# Altium footprint library ADP_SMT.PcbLib: 210 footprints (part 6 of 15)
Each footprint in its own frame and in the unit in brackets; x right, y up, seen from the top. Pads: shape width x height; smd on the part's side, far side on the other; paste and mask are expansions set on the pad; w line width, h text height; cw(c..) or ccw(c..) is an arc to the next point about the centre after c.
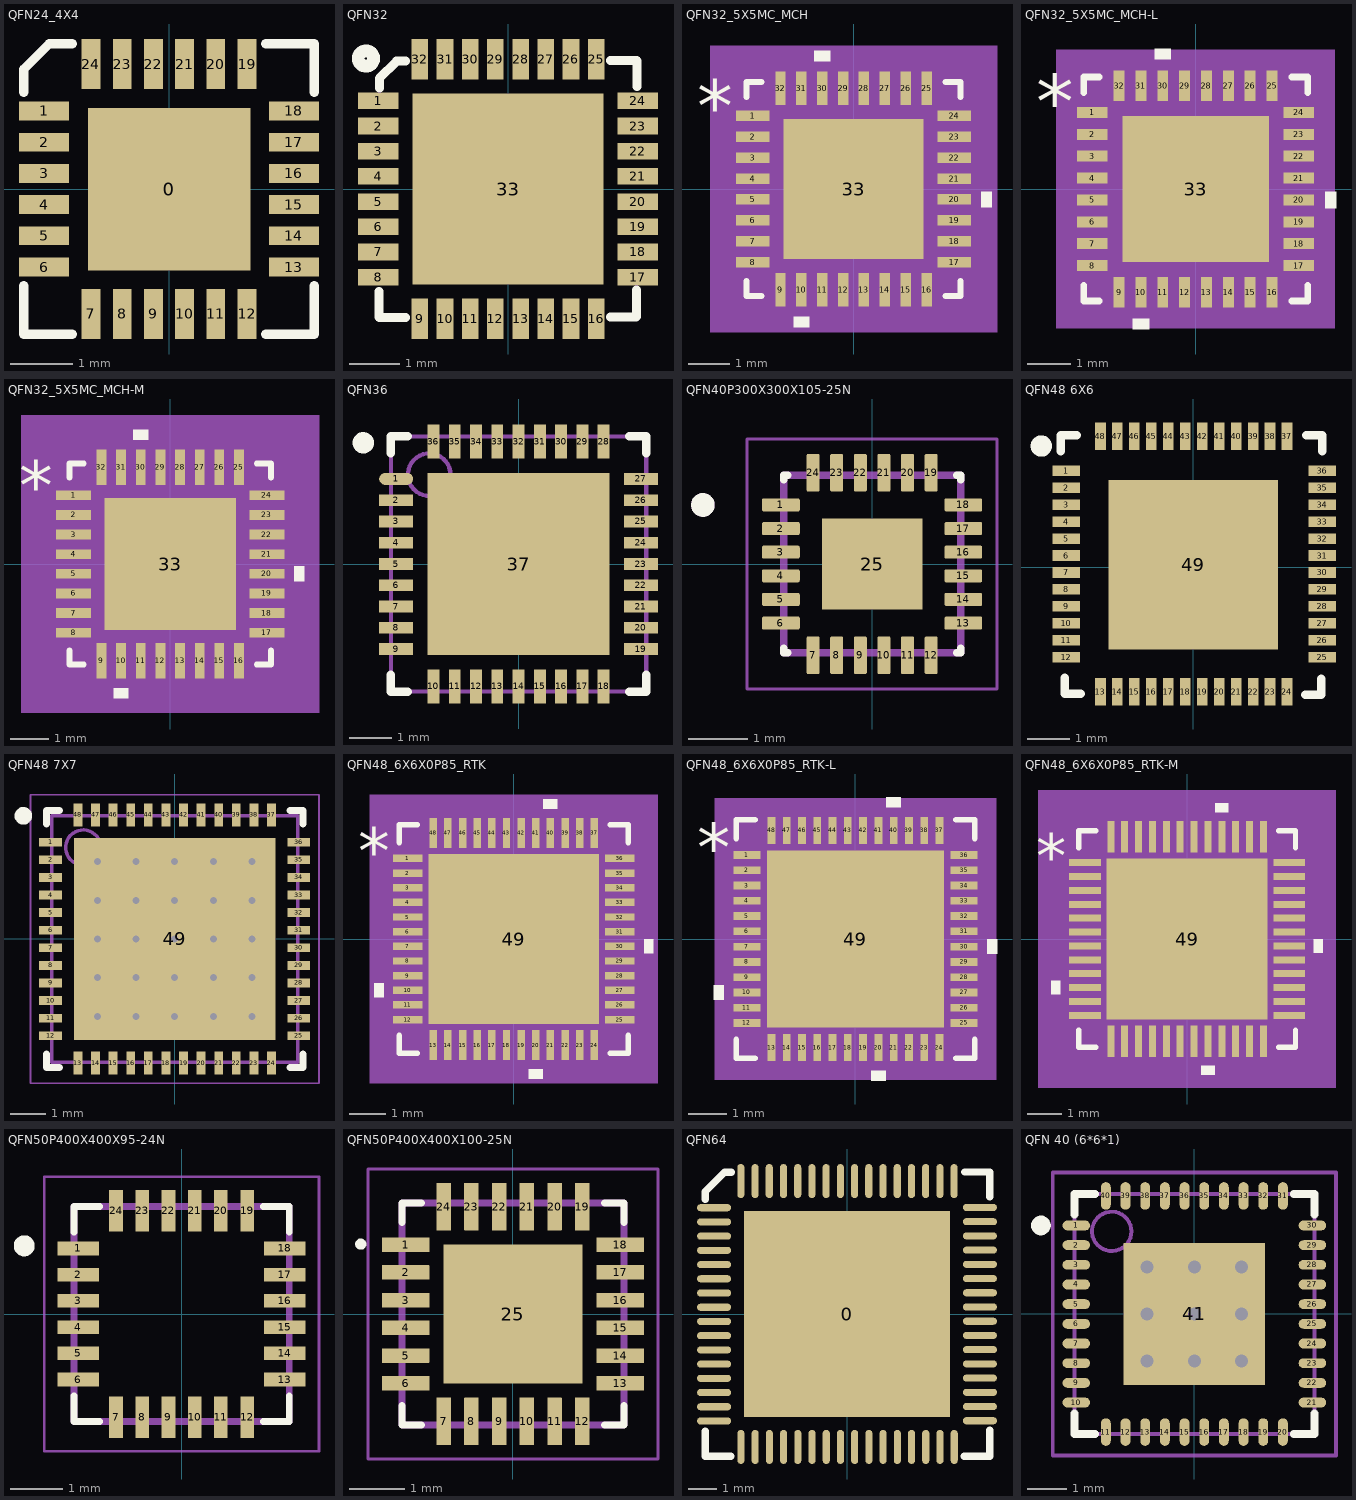
[diagram p5: the footprints below, top view; thin cyan lines are the x and y axes]

## QFN24_4X4 [mm]
pads (25):
  rect 2.6x2.6 smd: 0(0.005,0)
  rect 0.8x0.3 smd: 1(-2,1.25) 2(-2,0.75) 3(-2,0.25) 4(-2,-0.25) 5(-2,-0.75) 6(-2,-1.25) 13(2,-1.25) 14(2,-0.75) 15(2,-0.25) 16(2,0.25) 17(2,0.75) 18(2,1.25)
  rect 0.3x0.8 smd: 7(-1.25,-2) 8(-0.75,-2) 9(-0.25,-2) 10(0.25,-2) 11(0.75,-2) 12(1.25,-2) 19(1.25,2) 20(0.75,2) 21(0.25,2) 22(-0.25,2) 23(-0.75,2) 24(-1.25,2)
Top Overlay:
  lines w0.15: -2.325,-1.55 -2.325,-2.325 -1.55,-2.325 ; -2.325,1.55 -2.325,1.917 -1.917,2.325 -1.55,2.325 ; 1.55,-2.325 2.325,-2.325 2.325,-1.55 ; 1.55,2.325 2.325,2.325 2.325,1.55
3D body "QFN24.step": height 0.9, standoff 0, extent -1.997,-2.002 2.007,2.002

## QFN32 [mil]
pads (33):
  rect 31.5x13 smd: 1(-101.5,68.92) 2(-101.5,49.23) 3(-101.5,29.54) 4(-101.5,9.85) 5(-101.5,-9.85) 6(-101.5,-29.54) 7(-101.5,-49.23) 8(-101.5,-68.92) 17(101.5,-68.92) 18(101.5,-49.23) 19(101.5,-29.54) 20(101.5,-9.85) 21(101.5,9.85) 22(101.5,29.54) 23(101.5,49.23) 24(101.5,68.92)
  rect 13x31.5 smd: 9(-68.92,-101.5) 10(-49.23,-101.5) 11(-29.54,-101.5) 12(-9.85,-101.5) 13(9.85,-101.5) 14(29.54,-101.5) 15(49.23,-101.5) 16(68.92,-101.5) 25(68.92,101.5) 26(49.23,101.5) 27(29.54,101.5) 28(9.85,101.5) 29(-9.85,101.5) 30(-29.54,101.5) 31(-49.23,101.5) 32(-68.92,101.5)
  rect 149.61x149.61 smd: 33(0,0)
Top Overlay:
  circle w10: c-111,102 r6
  lines w7: -101,-80 -101,-100 -100.5,-100.5 -80,-100.5 ; -100.5,79 -100.5,86.5 -87,100 -80,100 ; 80,-100 100,-100 100.5,-99.5 100.5,-79 ; 80,100.5 100.5,100.5 101,100 101,80
3D body "qfn32-5x5.step": height 31.5, standoff 0, extent -98.2,-98.81 99.44,98.82

## QFN32_5X5MC_MCH [mil]
pads (33):
  rect 32x10 smd paste+0 mask+0: 1(-96.5,70) 2(-96.5,50) 3(-96.5,30) 4(-96.5,10) 5(-96.5,-10) 6(-96.5,-30) 7(-96.5,-50) 8(-96.5,-70) 17(96.5,-70) 18(96.5,-50) 19(96.5,-30) 20(96.5,-10) 21(96.5,10) 22(96.5,30) 23(96.5,50) 24(96.5,70)
  rect 10x32 smd paste+0 mask+0: 9(-70,-96.5) 10(-50,-96.5) 11(-30,-96.5) 12(-10,-96.5) 13(10,-96.5) 14(30,-96.5) 15(50,-96.5) 16(70,-96.5) 25(70,96.5) 26(50,96.5) 27(30,96.5) 28(10,96.5) 29(-10,96.5) 30(-30,96.5) 31(-50,96.5) 32(-70,96.5)
  rect 134x134 smd paste-66.5 mask-66.5: 33(0,0)
Top Overlay:
  region: -22.5,122.5 -37.5,122.5 -37.5,132.5 -22.5,132.5
  region: 122.5,-2.5 132.5,-2.5 132.5,-17.5 122.5,-17.5
  region: -42.5,-122.5 -57.5,-122.5 -57.5,-132.5 -42.5,-132.5
  lines w6: -102.5,-88.1 -102.5,-102.5 -88.1,-102.5 ; -102.5,88.1 -102.5,102.5 -88.1,102.5 ; 88.1,-102.5 102.5,-102.5 102.5,-88.1 ; 88.1,102.5 102.5,102.5 102.5,88.1
  text "*" at -150,55 h50
Top Paste:
  drawing of 25 lines, arcs and shapes, not listed
Top Solder:
  region: 54.37,-69.5 54.37,69.5 69.5,69.5 69.5,-69.5
  region: 38.63,-69.5 38.63,69.5 23.37,69.5 23.37,-69.5
  region: 7.63,-69.5 7.63,69.5 -7.63,69.5 -7.63,-69.5
  region: -23.37,-69.5 -23.37,69.5 -38.63,69.5 -38.63,-69.5
  region: -69.5,-69.5 -69.5,69.5 -54.37,69.5 -54.37,-69.5
  region: -69.5,-69.5 -69.5,-54.37 69.5,-54.37 69.5,-69.5
  region: -69.5,-38.63 -69.5,-23.37 69.5,-23.37 69.5,-38.63
  region: -69.5,-7.63 -69.5,7.63 69.5,7.63 69.5,-7.63
  region: -69.5,23.37 -69.5,38.63 69.5,38.63 69.5,23.37
  region: -69.5,54.37 -69.5,69.5 69.5,69.5 69.5,54.37
Mechanical 5:
  region: 137.5,-137.5 -137.5,-137.5 -137.5,137.5 137.5,137.5
Mechanical 13:
  lines w1: -97.5,47.5 -47.5,97.5 ; -100.5,-76 -97.5,-76 -97.5,-64 -100.5,-64 -100.5,-76 ; -100.5,-56 -97.5,-56 -97.5,-44 -100.5,-44 -100.5,-56 ; -100.5,-36 -97.5,-36 -97.5,-24 -100.5,-24 -100.5,-36 ; -100.5,-16 -97.5,-16 -97.5,-4 -100.5,-4 -100.5,-16 ; -100.5,4 -97.5,4 -97.5,16 -100.5,16 -100.5,4 ; -100.5,24 -97.5,24 -97.5,36 -100.5,36 -100.5,24 ; -100.5,44 -97.5,44 -97.5,56 -100.5,56 -100.5,44 ; -100.5,64 -97.5,64 -97.5,76 -100.5,76 -100.5,64 ; -97.5,-97.5 -97.5,97.5 97.5,97.5 97.5,-97.5 -97.5,-97.5 ; -76,-100.5 -64,-100.5 -64,-97.5 -76,-97.5 -76,-100.5 ; -76,97.5 -76,100.5 -64,100.5 -64,97.5 -76,97.5 ; -56,-100.5 -44,-100.5 -44,-97.5 -56,-97.5 -56,-100.5 ; -56,97.5 -56,100.5 -44,100.5 -44,97.5 -56,97.5 ; -36,-100.5 -24,-100.5 -24,-97.5 -36,-97.5 -36,-100.5 ; -36,97.5 -36,100.5 -24,100.5 -24,97.5 -36,97.5 ; -16,-100.5 -4,-100.5 -4,-97.5 -16,-97.5 -16,-100.5 ; -16,97.5 -16,100.5 -4,100.5 -4,97.5 -16,97.5 ; 4,-100.5 16,-100.5 16,-97.5 4,-97.5 4,-100.5 ; 4,97.5 4,100.5 16,100.5 16,97.5 4,97.5 ; 24,-100.5 36,-100.5 36,-97.5 24,-97.5 24,-100.5 ; 24,97.5 24,100.5 36,100.5 36,97.5 24,97.5 ; 44,-100.5 56,-100.5 56,-97.5 44,-97.5 44,-100.5 ; 44,97.5 44,100.5 56,100.5 56,97.5 44,97.5 ; 64,-100.5 76,-100.5 76,-97.5 64,-97.5 64,-100.5 ; 64,97.5 64,100.5 76,100.5 76,97.5 64,97.5 ; 97.5,-76 100.5,-76 100.5,-64 97.5,-64 97.5,-76 ; 97.5,-56 100.5,-56 100.5,-44 97.5,-44 97.5,-56 ; 97.5,-36 100.5,-36 100.5,-24 97.5,-24 97.5,-36 ; 97.5,-16 100.5,-16 100.5,-4 97.5,-4 97.5,-16 ; 97.5,4 100.5,4 100.5,16 97.5,16 97.5,4 ; 97.5,24 100.5,24 100.5,36 97.5,36 97.5,24 ; 97.5,44 100.5,44 100.5,56 97.5,56 97.5,44 ; 97.5,64 100.5,64 100.5,76 97.5,76 97.5,64
  text "*" at -93,55 h50
Mechanical 15:
  region: -85,-107.5 -107.5,-107.5 -107.5,-85 -122.5,-85 -122.5,85 -107.5,85 -107.5,107.5 -85,107.5 -85,122.5 85,122.5 85,107.5 107.5,107.5 107.5,85 122.5,85 122.5,-85 107.5,-85 107.5,-107.5 85,-107.5 85,-122.5 -85,-122.5
  lines w6: -122.5,-85 -122.5,85 -107.5,85 -107.5,107.5 -85,107.5 -85,122.5 85,122.5 85,107.5 107.5,107.5 107.5,85 122.5,85 122.5,-85 107.5,-85 107.5,-107.5 85,-107.5 85,-122.5 -85,-122.5 -85,-107.5 -107.5,-107.5 -107.5,-85 -122.5,-85
3D body "QFN32_5X5MC_MCH.step": height 65.12, standoff 0, extent -100.51,-100.51 100.51,100.51

## QFN32_5X5MC_MCH-L [mil]
pads (33):
  rect 28x10 smd paste+0 mask+0: 1(-94.5,70) 2(-94.5,50) 3(-94.5,30) 4(-94.5,10) 5(-94.5,-10) 6(-94.5,-30) 7(-94.5,-50) 8(-94.5,-70) 17(94.5,-70) 18(94.5,-50) 19(94.5,-30) 20(94.5,-10) 21(94.5,10) 22(94.5,30) 23(94.5,50) 24(94.5,70)
  rect 10x28 smd paste+0 mask+0: 9(-70,-94.5) 10(-50,-94.5) 11(-30,-94.5) 12(-10,-94.5) 13(10,-94.5) 14(30,-94.5) 15(50,-94.5) 16(70,-94.5) 25(70,94.5) 26(50,94.5) 27(30,94.5) 28(10,94.5) 29(-10,94.5) 30(-30,94.5) 31(-50,94.5) 32(-70,94.5)
  rect 134x134 smd paste-66.5 mask-66.5: 33(0,0)
Top Overlay:
  region: -42.5,-118.5 -57.5,-118.5 -57.5,-128.5 -42.5,-128.5
  region: 118.5,-2.5 128.5,-2.5 128.5,-17.5 118.5,-17.5
  region: -22.5,118.5 -37.5,118.5 -37.5,128.5 -22.5,128.5
  lines w6: -102.5,-88.1 -102.5,-102.5 -88.1,-102.5 ; -102.5,88.1 -102.5,102.5 -88.1,102.5 ; 88.1,-102.5 102.5,-102.5 102.5,-88.1 ; 88.1,102.5 102.5,102.5 102.5,88.1
  text "*" at -146,55 h50
Top Paste:
  drawing of 25 lines, arcs and shapes, not listed
Top Solder:
  region: -69.5,54.37 -69.5,69.5 69.5,69.5 69.5,54.37
  region: -69.5,23.37 -69.5,38.63 69.5,38.63 69.5,23.37
  region: -69.5,-7.63 -69.5,7.63 69.5,7.63 69.5,-7.63
  region: -69.5,-38.63 -69.5,-23.37 69.5,-23.37 69.5,-38.63
  region: -69.5,-69.5 -69.5,-54.37 69.5,-54.37 69.5,-69.5
  region: -69.5,-69.5 -69.5,69.5 -54.37,69.5 -54.37,-69.5
  region: -23.37,-69.5 -23.37,69.5 -38.63,69.5 -38.63,-69.5
  region: 7.63,-69.5 7.63,69.5 -7.63,69.5 -7.63,-69.5
  region: 38.63,-69.5 38.63,69.5 23.37,69.5 23.37,-69.5
  region: 54.37,-69.5 54.37,69.5 69.5,69.5 69.5,-69.5
Mechanical 5:
  region: 127.5,-127.5 -127.5,-127.5 -127.5,127.5 127.5,127.5
Mechanical 13:
  lines w1: -97.5,47.5 -47.5,97.5 ; -100.5,-76 -100.5,-64 -97.5,-64 -97.5,-76 -100.5,-76 ; -100.5,-56 -100.5,-44 -97.5,-44 -97.5,-56 -100.5,-56 ; -100.5,-36 -100.5,-24 -97.5,-24 -97.5,-36 -100.5,-36 ; -100.5,-16 -100.5,-4 -97.5,-4 -97.5,-16 -100.5,-16 ; -100.5,4 -100.5,16 -97.5,16 -97.5,4 -100.5,4 ; -100.5,24 -100.5,36 -97.5,36 -97.5,24 -100.5,24 ; -100.5,44 -100.5,56 -97.5,56 -97.5,44 -100.5,44 ; -100.5,64 -100.5,76 -97.5,76 -97.5,64 -100.5,64 ; -97.5,-97.5 97.5,-97.5 97.5,97.5 -97.5,97.5 -97.5,-97.5 ; -76,-100.5 -76,-97.5 -64,-97.5 -64,-100.5 -76,-100.5 ; -76,97.5 -64,97.5 -64,100.5 -76,100.5 -76,97.5 ; -56,-100.5 -56,-97.5 -44,-97.5 -44,-100.5 -56,-100.5 ; -56,97.5 -44,97.5 -44,100.5 -56,100.5 -56,97.5 ; -36,-100.5 -36,-97.5 -24,-97.5 -24,-100.5 -36,-100.5 ; -36,97.5 -24,97.5 -24,100.5 -36,100.5 -36,97.5 ; -16,-100.5 -16,-97.5 -4,-97.5 -4,-100.5 -16,-100.5 ; -16,97.5 -4,97.5 -4,100.5 -16,100.5 -16,97.5 ; 4,-100.5 4,-97.5 16,-97.5 16,-100.5 4,-100.5 ; 4,97.5 16,97.5 16,100.5 4,100.5 4,97.5 ; 24,-100.5 24,-97.5 36,-97.5 36,-100.5 24,-100.5 ; 24,97.5 36,97.5 36,100.5 24,100.5 24,97.5 ; 44,-100.5 44,-97.5 56,-97.5 56,-100.5 44,-100.5 ; 44,97.5 56,97.5 56,100.5 44,100.5 44,97.5 ; 64,-100.5 64,-97.5 76,-97.5 76,-100.5 64,-100.5 ; 64,97.5 76,97.5 76,100.5 64,100.5 64,97.5 ; 97.5,-76 97.5,-64 100.5,-64 100.5,-76 97.5,-76 ; 97.5,-56 97.5,-44 100.5,-44 100.5,-56 97.5,-56 ; 97.5,-36 97.5,-24 100.5,-24 100.5,-36 97.5,-36 ; 97.5,-16 97.5,-4 100.5,-4 100.5,-16 97.5,-16 ; 97.5,4 97.5,16 100.5,16 100.5,4 97.5,4 ; 97.5,24 97.5,36 100.5,36 100.5,24 97.5,24 ; 97.5,44 97.5,56 100.5,56 100.5,44 97.5,44 ; 97.5,64 97.5,76 100.5,76 100.5,64 97.5,64
  text "*" at -93,55 h50
Mechanical 15:
  region: -79,-101.5 -101.5,-101.5 -101.5,-79 -112.5,-79 -112.5,79 -101.5,79 -101.5,101.5 -79,101.5 -79,112.5 79,112.5 79,101.5 101.5,101.5 101.5,79 112.5,79 112.5,-79 101.5,-79 101.5,-101.5 79,-101.5 79,-112.5 -79,-112.5
  lines w6: -112.5,-79 -101.5,-79 -101.5,-101.5 -79,-101.5 -79,-112.5 79,-112.5 79,-101.5 101.5,-101.5 101.5,-79 112.5,-79 112.5,79 101.5,79 101.5,101.5 79,101.5 79,112.5 -79,112.5 -79,101.5 -101.5,101.5 -101.5,79 -112.5,79 -112.5,-79
3D body "QFN32_5X5MC_MCH.step": height 65.12, standoff 0, extent -100.51,-100.51 100.51,100.51

## QFN32_5X5MC_MCH-M [mil]
pads (33):
  rect 36x10 smd paste+0 mask+0: 1(-98.5,70) 2(-98.5,50) 3(-98.5,30) 4(-98.5,10) 5(-98.5,-10) 6(-98.5,-30) 7(-98.5,-50) 8(-98.5,-70) 17(98.5,-70) 18(98.5,-50) 19(98.5,-30) 20(98.5,-10) 21(98.5,10) 22(98.5,30) 23(98.5,50) 24(98.5,70)
  rect 10x36 smd paste+0 mask+0: 9(-70,-98.5) 10(-50,-98.5) 11(-30,-98.5) 12(-10,-98.5) 13(10,-98.5) 14(30,-98.5) 15(50,-98.5) 16(70,-98.5) 25(70,98.5) 26(50,98.5) 27(30,98.5) 28(10,98.5) 29(-10,98.5) 30(-30,98.5) 31(-50,98.5) 32(-70,98.5)
  rect 134x134 smd paste-66.5 mask-66.5: 33(0,0)
Top Overlay:
  region: -22.5,126.5 -37.5,126.5 -37.5,136.5 -22.5,136.5
  region: 126.5,-2.5 136.5,-2.5 136.5,-17.5 126.5,-17.5
  region: -42.5,-126.5 -57.5,-126.5 -57.5,-136.5 -42.5,-136.5
  lines w6: -102.5,-88.1 -102.5,-102.5 -88.1,-102.5 ; -102.5,88.1 -102.5,102.5 -88.1,102.5 ; 88.1,-102.5 102.5,-102.5 102.5,-88.1 ; 88.1,102.5 102.5,102.5 102.5,88.1
  text "*" at -154,55 h50
Top Paste:
  drawing of 25 lines, arcs and shapes, not listed
Top Solder:
  region: 54.37,-69.5 54.37,69.5 69.5,69.5 69.5,-69.5
  region: 38.63,-69.5 38.63,69.5 23.37,69.5 23.37,-69.5
  region: 7.63,-69.5 7.63,69.5 -7.63,69.5 -7.63,-69.5
  region: -23.37,-69.5 -23.37,69.5 -38.63,69.5 -38.63,-69.5
  region: -69.5,-69.5 -69.5,69.5 -54.37,69.5 -54.37,-69.5
  region: -69.5,-69.5 -69.5,-54.37 69.5,-54.37 69.5,-69.5
  region: -69.5,-38.63 -69.5,-23.37 69.5,-23.37 69.5,-38.63
  region: -69.5,-7.63 -69.5,7.63 69.5,7.63 69.5,-7.63
  region: -69.5,23.37 -69.5,38.63 69.5,38.63 69.5,23.37
  region: -69.5,54.37 -69.5,69.5 69.5,69.5 69.5,54.37
Mechanical 5:
  region: 151.5,-151.5 -151.5,-151.5 -151.5,151.5 151.5,151.5
Mechanical 13:
  lines w1: -97.5,47.5 -47.5,97.5 ; -100.5,-76 -97.5,-76 -97.5,-64 -100.5,-64 -100.5,-76 ; -100.5,-56 -97.5,-56 -97.5,-44 -100.5,-44 -100.5,-56 ; -100.5,-36 -97.5,-36 -97.5,-24 -100.5,-24 -100.5,-36 ; -100.5,-16 -97.5,-16 -97.5,-4 -100.5,-4 -100.5,-16 ; -100.5,4 -97.5,4 -97.5,16 -100.5,16 -100.5,4 ; -100.5,24 -97.5,24 -97.5,36 -100.5,36 -100.5,24 ; -100.5,44 -97.5,44 -97.5,56 -100.5,56 -100.5,44 ; -100.5,64 -97.5,64 -97.5,76 -100.5,76 -100.5,64 ; -97.5,-97.5 -97.5,97.5 97.5,97.5 97.5,-97.5 -97.5,-97.5 ; -76,-100.5 -64,-100.5 -64,-97.5 -76,-97.5 -76,-100.5 ; -76,97.5 -76,100.5 -64,100.5 -64,97.5 -76,97.5 ; -56,-100.5 -44,-100.5 -44,-97.5 -56,-97.5 -56,-100.5 ; -56,97.5 -56,100.5 -44,100.5 -44,97.5 -56,97.5 ; -36,-100.5 -24,-100.5 -24,-97.5 -36,-97.5 -36,-100.5 ; -36,97.5 -36,100.5 -24,100.5 -24,97.5 -36,97.5 ; -16,-100.5 -4,-100.5 -4,-97.5 -16,-97.5 -16,-100.5 ; -16,97.5 -16,100.5 -4,100.5 -4,97.5 -16,97.5 ; 4,-100.5 16,-100.5 16,-97.5 4,-97.5 4,-100.5 ; 4,97.5 4,100.5 16,100.5 16,97.5 4,97.5 ; 24,-100.5 36,-100.5 36,-97.5 24,-97.5 24,-100.5 ; 24,97.5 24,100.5 36,100.5 36,97.5 24,97.5 ; 44,-100.5 56,-100.5 56,-97.5 44,-97.5 44,-100.5 ; 44,97.5 44,100.5 56,100.5 56,97.5 44,97.5 ; 64,-100.5 76,-100.5 76,-97.5 64,-97.5 64,-100.5 ; 64,97.5 64,100.5 76,100.5 76,97.5 64,97.5 ; 97.5,-76 100.5,-76 100.5,-64 97.5,-64 97.5,-76 ; 97.5,-56 100.5,-56 100.5,-44 97.5,-44 97.5,-56 ; 97.5,-36 100.5,-36 100.5,-24 97.5,-24 97.5,-36 ; 97.5,-16 100.5,-16 100.5,-4 97.5,-4 97.5,-16 ; 97.5,4 100.5,4 100.5,16 97.5,16 97.5,4 ; 97.5,24 100.5,24 100.5,36 97.5,36 97.5,24 ; 97.5,44 100.5,44 100.5,56 97.5,56 97.5,44 ; 97.5,64 100.5,64 100.5,76 97.5,76 97.5,64
  text "*" at -93,55 h50
Mechanical 15:
  region: -95,-117.5 -117.5,-117.5 -117.5,-95 -136.5,-95 -136.5,95 -117.5,95 -117.5,117.5 -95,117.5 -95,136.5 95,136.5 95,117.5 117.5,117.5 117.5,95 136.5,95 136.5,-95 117.5,-95 117.5,-117.5 95,-117.5 95,-136.5 -95,-136.5
  lines w6: -136.5,-95 -136.5,95 -117.5,95 -117.5,117.5 -95,117.5 -95,136.5 95,136.5 95,117.5 117.5,117.5 117.5,95 136.5,95 136.5,-95 117.5,-95 117.5,-117.5 95,-117.5 95,-136.5 -95,-136.5 -95,-117.5 -117.5,-117.5 -117.5,-95 -136.5,-95
3D body "QFN32_5X5MC_MCH.step": height 65.12, standoff 0, extent -100.51,-100.51 100.51,100.51

## QFN36 [mm] "PQFN, 36-Leads, Body 6.00x6.00mm, Pitch 0.50mm, Thermal Pad 4.28x4.28mm, IPC Medium Density"
height 1
pads (37):
  oval 0.8x0.28 smd: 1(-2.879,2)
  rect 0.8x0.28 smd: 2(-2.879,1.5) 3(-2.879,1) 4(-2.879,0.5) 5(-2.879,0) 6(-2.879,-0.5) 7(-2.879,-1) 8(-2.879,-1.5) 9(-2.879,-2) 19(2.879,-2) 20(2.879,-1.5) 21(2.879,-1) 22(2.879,-0.5) 23(2.879,0) 24(2.879,0.5) 25(2.879,1) 26(2.879,1.5) 27(2.879,2)
  rect 0.28x0.8 smd: 10(-2,-2.879) 11(-1.5,-2.879) 12(-1,-2.879) 13(-0.5,-2.879) 14(0,-2.879) 15(0.5,-2.879) 16(1,-2.879) 17(1.5,-2.879) 18(2,-2.879) 28(2,2.879) 29(1.5,2.879) 30(1,2.879) 31(0.5,2.879) 32(0,2.879) 33(-0.5,2.879) 34(-1,2.879) 35(-1.5,2.879) 36(-2,2.879)
  rect 4.28x4.28 smd: 37(0,0)
Top Overlay:
  circle w0.25: c-3.65,2.85 r0.125
  lines w0.2: -3,-2.6 -3,-3 -2.6,-3 ; -3,2.6 -3,3 -2.6,3 ; 2.6,-3 3,-3 3,-2.6 ; 2.6,3 3,3 3,2.6
Mechanical 13:
  circle w0.1: c-2.1,2.1 r0.5
  lines w0.1: -3,-3 -3,3 3,3 3,-3 -3,-3
3D body "QFN36 6x6.STEP": height 0.9, standoff 0.01, extent -3.102,-3.102 3.103,3.103

## QFN40P300X300X105-25N [mm]
height 1.05
pads (25):
  rrect25% 0.64x0.22 smd: 1(-1.545,1) 2(-1.545,0.6) 3(-1.545,0.2) 4(-1.545,-0.2) 5(-1.545,-0.6) 6(-1.545,-1) 13(1.545,-1) 14(1.545,-0.6) 15(1.545,-0.2) 16(1.545,0.2) 17(1.545,0.6) 18(1.545,1)
  rrect25% 0.22x0.64 smd: 7(-1,-1.545) 8(-0.6,-1.545) 9(-0.2,-1.545) 10(0.2,-1.545) 11(0.6,-1.545) 12(1,-1.545) 19(1,1.545) 20(0.6,1.545) 21(0.2,1.545) 22(-0.2,1.545) 23(-0.6,1.545) 24(-1,1.545)
  rect 1.7x1.54 smd paste-2: 25(0,0)
Top Overlay:
  circle w0.2: c-2.865,1 r0.1
  lines w0.127: -1.5,-1.43 -1.5,-1.5 -1.43,-1.5 ; -1.5,1.43 -1.5,1.5 -1.43,1.5 ; 1.43,-1.5 1.5,-1.5 1.5,-1.43 ; 1.43,1.5 1.5,1.5 1.5,1.43
Top Paste:
  region: 0.538,-0.487 -0.538,-0.487 -0.538,0.487 0.538,0.487
Mechanical 13:
  circle w0.2: c-2.865,1 r0.1
  lines w0.127: -1.5,-1.5 -1.5,1.5 1.5,1.5 1.5,-1.5 -1.5,-1.5
Mechanical 15:
  lines w0.05: -2.115,-2.115 2.115,-2.115 2.115,2.115 -2.115,2.115 -2.115,-2.115
3D body "step_temp.STEP": height 1.05, standoff 0, extent -1.5,-1.5 1.5,1.5

## QFN48 6X6 [mm] "QFN, 48-Leads, Body 7.00x7.00mm, Pitch 0.50mm, Thermal Pad 5.73x5.73mm, IPC Medium Density"
height 1
pads (49):
  rect 0.65x0.25 smd: 1(-2.997,2.271) 2(-2.997,1.871) 3(-2.997,1.471) 4(-2.997,1.071) 5(-2.997,0.671) 6(-2.997,0.271) 7(-2.997,-0.129) 8(-2.997,-0.529) 9(-2.997,-0.929) 10(-2.997,-1.329) 11(-2.997,-1.729) 12(-2.997,-2.129) 25(3.048,-2.129) 26(3.048,-1.729) 27(3.048,-1.329) 28(3.048,-0.929) 29(3.048,-0.529) 30(3.048,-0.129) 31(3.048,0.271) 32(3.048,0.671) 33(3.048,1.071) 34(3.048,1.471) 35(3.048,1.871) 36(3.048,2.271)
  rect 0.25x0.65 smd: 13(-2.184,-2.941) 14(-1.784,-2.941) 15(-1.384,-2.941) 16(-0.984,-2.941) 17(-0.584,-2.941) 18(-0.184,-2.941) 19(0.216,-2.941) 20(0.616,-2.941) 21(1.016,-2.941) 22(1.416,-2.941) 23(1.816,-2.941) 24(2.216,-2.941) 37(2.216,3.083) 38(1.816,3.083) 39(1.416,3.083) 40(1.016,3.083) 41(0.616,3.083) 42(0.216,3.083) 43(-0.184,3.083) 44(-0.584,3.083) 45(-0.984,3.083) 46(-1.384,3.083) 47(-1.784,3.083) 48(-2.184,3.083)
  rect 4x4 smd: 49(0,0.055)
Top Overlay:
  circle w0.25: c-3.581,2.855 r0.125
  lines w0.2: -3.118,2.734 -3.118,3.109 -2.743,3.109 ; -3.023,-2.612 -3.023,-2.987 -2.648,-2.987 ; 2.648,-3.013 3.023,-3.013 3.023,-2.638 ; 2.673,3.109 3.048,3.109 3.048,2.734
3D body "QFN48.step": height 0.85, standoff -0.02, extent -2.992,-2.931 3.048,3.109

## QFN48 7X7 [mm] "QFN, 48-Leads, Body 7.00x7.00mm, Pitch 0.50mm, Thermal Pad 5.73x5.73mm, IPC Medium Density"
height 1
pads (49):
  rect 0.65x0.25 smd: 1(-3.525,2.75) 2(-3.525,2.25) 3(-3.525,1.75) 4(-3.525,1.25) 5(-3.525,0.75) 6(-3.525,0.25) 7(-3.525,-0.25) 8(-3.525,-0.75) 9(-3.525,-1.25) 10(-3.525,-1.75) 11(-3.525,-2.25) 12(-3.525,-2.75) 25(3.525,-2.75) 26(3.525,-2.25) 27(3.525,-1.75) 28(3.525,-1.25) 29(3.525,-0.75) 30(3.525,-0.25) 31(3.525,0.25) 32(3.525,0.75) 33(3.525,1.25) 34(3.525,1.75) 35(3.525,2.25) 36(3.525,2.75)
  rect 0.25x0.65 smd: 13(-2.75,-3.525) 14(-2.25,-3.525) 15(-1.75,-3.525) 16(-1.25,-3.525) 17(-0.75,-3.525) 18(-0.25,-3.525) 19(0.25,-3.525) 20(0.75,-3.525) 21(1.25,-3.525) 22(1.75,-3.525) 23(2.25,-3.525) 24(2.75,-3.525) 37(2.75,3.525) 38(2.25,3.525) 39(1.75,3.525) 40(1.25,3.525) 41(0.75,3.525) 42(0.25,3.525) 43(-0.25,3.525) 44(-0.75,3.525) 45(-1.25,3.525) 46(-1.75,3.525) 47(-2.25,3.525) 48(-2.75,3.525)
  rect 5.73x5.73 smd: 49(0,0)
via -2.2,2.2 diameter 0.5 hole 0.2
via -1.1,2.2 diameter 0.5 hole 0.2
via 0,2.2 diameter 0.5 hole 0.2
via 1.1,2.2 diameter 0.5 hole 0.2
via 2.2,2.2 diameter 0.5 hole 0.2
via -2.2,1.1 diameter 0.5 hole 0.2
via -1.1,1.1 diameter 0.5 hole 0.2
via 0,1.1 diameter 0.5 hole 0.2
via 1.1,1.1 diameter 0.5 hole 0.2
via 2.2,1.1 diameter 0.5 hole 0.2
via -2.2,0 diameter 0.5 hole 0.2
via -1.1,0 diameter 0.5 hole 0.2
via 0,0 diameter 0.5 hole 0.2
via 1.1,0 diameter 0.5 hole 0.2
via 2.2,0 diameter 0.5 hole 0.2
via -2.2,-1.1 diameter 0.5 hole 0.2
via -1.1,-1.1 diameter 0.5 hole 0.2
via 0,-1.1 diameter 0.5 hole 0.2
via 1.1,-1.1 diameter 0.5 hole 0.2
via 2.2,-1.1 diameter 0.5 hole 0.2
via -2.2,-2.2 diameter 0.5 hole 0.2
via -1.1,-2.2 diameter 0.5 hole 0.2
via 0,-2.2 diameter 0.5 hole 0.2
via 1.1,-2.2 diameter 0.5 hole 0.2
via 2.2,-2.2 diameter 0.5 hole 0.2
Top Overlay:
  circle w0.25: c-4.3,3.5 r0.125
  lines w0.2: -3.65,-3.275 -3.65,-3.65 -3.275,-3.65 ; -3.65,3.275 -3.65,3.65 -3.275,3.65 ; 3.275,-3.65 3.65,-3.65 3.65,-3.275 ; 3.275,3.65 3.65,3.65 3.65,3.275
Mechanical 13:
  circle w0.1: c-2.6,2.6 r0.5
  lines w0.1: -3.5,-3.5 -3.5,3.5 3.5,3.5 3.5,-3.5 -3.5,-3.5
Mechanical 15:
  lines w0.05: -4.1,-4.1 -4.1,4.1 4.1,4.1 4.1,-4.1 -4.1,-4.1
  lines w0.1: -0.5,0 0.5,0 ; 0,-0.5 0,0.5
3D body: height 1, standoff 0.08, extent -3.5,-3.556 3.5,3.444

## QFN48_6X6X0P85_RTK [mil]
pads (49):
  rect 32x8 smd paste+0 mask+0: 1(-114,86.61) 2(-114,70.87) 3(-114,55.12) 4(-114,39.37) 5(-114,23.62) 6(-114,7.87) 7(-114,-7.87) 8(-114,-23.62) 9(-114,-39.37) 10(-114,-55.12) 11(-114,-70.87) 12(-114,-86.61) 25(114,-86.61) 26(114,-70.87) 27(114,-55.12) 28(114,-39.37) 29(114,-23.62) 30(114,-7.87) 31(114,7.87) 32(114,23.62) 33(114,39.37) 34(114,55.12) 35(114,70.87) 36(114,86.61)
  rect 8x32 smd paste+0 mask+0: 13(-86.61,-114) 14(-70.87,-114) 15(-55.12,-114) 16(-39.37,-114) 17(-23.62,-114) 18(-7.87,-114) 19(7.87,-114) 20(23.62,-114) 21(39.37,-114) 22(55.12,-114) 23(70.87,-114) 24(86.61,-114) 37(86.61,114) 38(70.87,114) 39(55.12,114) 40(39.37,114) 41(23.62,114) 42(7.87,114) 43(-7.87,114) 44(-23.62,114) 45(-39.37,114) 46(-55.12,114) 47(-70.87,114) 48(-86.61,114)
  rect 183x183 smd paste-91 mask+0: 49(0,0)
Top Overlay:
  region: -140,-47.62 -150,-47.62 -150,-62.62 -140,-62.62
  region: 31.12,-140 16.12,-140 16.12,-150 31.12,-150
  region: 140,-0.37 150,-0.37 150,-15.37 140,-15.37
  region: 46.87,140 31.87,140 31.87,150 46.87,150
  lines w6: -123,-103.71 -123,-123 -103.71,-123 ; -123,103.71 -123,123 -103.71,123 ; 103.71,-123 123,-123 123,-103.71 ; 103.71,123 123,123 123,103.71
  text "*" at -167.5,69.49 h50
Top Paste:
  region: -34.44,87.56 -87.56,87.56 -87.56,34.44 -34.44,34.44
  region: -34.44,26.56 -87.56,26.56 -87.56,-26.56 -34.44,-26.56
  region: -34.44,-34.44 -87.56,-34.44 -87.56,-87.56 -34.44,-87.56
  region: 26.56,87.56 -26.56,87.56 -26.56,34.44 26.56,34.44
  region: 26.56,26.56 -26.56,26.56 -26.56,-26.56 26.56,-26.56
  region: 26.56,-34.44 -26.56,-34.44 -26.56,-87.56 26.56,-87.56
  region: 87.56,87.56 34.44,87.56 34.44,34.44 87.56,34.44
  region: 87.56,26.56 34.44,26.56 34.44,-26.56 87.56,-26.56
  region: 87.56,-34.44 34.44,-34.44 34.44,-87.56 87.56,-87.56
Mechanical 5:
  region: 155,-155 -155,-155 -155,155 155,155
Mechanical 13:
  lines w1: -118,68 -68,118 ; -118,-118 118,-118 118,118 -118,118 -118,-118 ; -118,-91.61 -118,-81.61 -118,-91.61 ; -118,-75.87 -118,-65.87 -118,-75.87 ; -118,-60.12 -118,-50.12 -118,-60.12 ; -118,-44.37 -118,-34.37 -118,-44.37 ; -118,-28.62 -118,-18.62 -118,-28.62 ; -118,-12.87 -118,-2.87 -118,-12.87 ; -118,2.87 -118,12.87 -118,2.87 ; -118,18.62 -118,28.62 -118,18.62 ; -118,34.37 -118,44.37 -118,34.37 ; -118,50.12 -118,60.12 -118,50.12 ; -118,65.87 -118,75.87 -118,65.87 ; -118,81.61 -118,91.61 -118,81.61 ; -91.61,-118 -81.61,-118 -91.61,-118 ; -91.61,118 -81.61,118 -91.61,118 ; -75.87,-118 -65.87,-118 -75.87,-118 ; -75.87,118 -65.87,118 -75.87,118 ; -60.12,-118 -50.12,-118 -60.12,-118 ; -60.12,118 -50.12,118 -60.12,118 ; -44.37,-118 -34.37,-118 -44.37,-118 ; -44.37,118 -34.37,118 -44.37,118 ; -28.62,-118 -18.62,-118 -28.62,-118 ; -28.62,118 -18.62,118 -28.62,118 ; -12.87,-118 -2.87,-118 -12.87,-118 ; -12.87,118 -2.87,118 -12.87,118 ; 2.87,-118 12.87,-118 2.87,-118 ; 2.87,118 12.87,118 2.87,118 ; 18.62,-118 28.62,-118 18.62,-118 ; 18.62,118 28.62,118 18.62,118 ; 34.37,-118 44.37,-118 34.37,-118 ; 34.37,118 44.37,118 34.37,118 ; 50.12,-118 60.12,-118 50.12,-118 ; 50.12,118 60.12,118 50.12,118 ; 65.87,-118 75.87,-118 65.87,-118 ; 65.87,118 75.87,118 65.87,118 ; 81.61,-118 91.61,-118 81.61,-118 ; 81.61,118 91.61,118 81.61,118 ; 118,-91.61 118,-81.61 118,-91.61 ; 118,-75.87 118,-65.87 118,-75.87 ; 118,-60.12 118,-50.12 118,-60.12 ; 118,-44.37 118,-34.37 118,-44.37 ; 118,-28.62 118,-18.62 118,-28.62 ; 118,-12.87 118,-2.87 118,-12.87 ; 118,2.87 118,12.87 118,2.87 ; 118,18.62 118,28.62 118,18.62 ; 118,34.37 118,44.37 118,34.37 ; 118,50.12 118,60.12 118,50.12 ; 118,65.87 118,75.87 118,65.87 ; 118,81.61 118,91.61 118,81.61
  text "*" at -110.5,69.49 h50
Mechanical 15:
  region: -100.61,-128 -128,-128 -128,-100.61 -140,-100.61 -140,100.61 -128,100.61 -128,128 -100.61,128 -100.61,140 100.61,140 100.61,128 128,128 128,100.61 140,100.61 140,-100.61 128,-100.61 128,-128 100.61,-128 100.61,-140 -100.61,-140
  lines w6: -140,-100.61 -128,-100.61 -128,-128 -100.61,-128 -100.61,-140 100.61,-140 100.61,-128 128,-128 128,-100.61 140,-100.61 140,100.61 128,100.61 128,128 100.61,128 100.61,140 -100.61,140 -100.61,128 -128,128 -128,100.61 -140,100.61 -140,-100.61
3D body "QFN48_6X6X0P85_RTK.step": height 39.09, standoff 0, extent -117.99,-117.99 117.99,117.99

## QFN48_6X6X0P85_RTK-L [mil]
pads (49):
  rect 28x8 smd paste+0 mask+0: 1(-112,86.61) 2(-112,70.87) 3(-112,55.12) 4(-112,39.37) 5(-112,23.62) 6(-112,7.87) 7(-112,-7.87) 8(-112,-23.62) 9(-112,-39.37) 10(-112,-55.12) 11(-112,-70.87) 12(-112,-86.61) 25(112,-86.61) 26(112,-70.87) 27(112,-55.12) 28(112,-39.37) 29(112,-23.62) 30(112,-7.87) 31(112,7.87) 32(112,23.62) 33(112,39.37) 34(112,55.12) 35(112,70.87) 36(112,86.61)
  rect 8x28 smd paste+0 mask+0: 13(-86.61,-112) 14(-70.87,-112) 15(-55.12,-112) 16(-39.37,-112) 17(-23.62,-112) 18(-7.87,-112) 19(7.87,-112) 20(23.62,-112) 21(39.37,-112) 22(55.12,-112) 23(70.87,-112) 24(86.61,-112) 37(86.61,112) 38(70.87,112) 39(55.12,112) 40(39.37,112) 41(23.62,112) 42(7.87,112) 43(-7.87,112) 44(-23.62,112) 45(-39.37,112) 46(-55.12,112) 47(-70.87,112) 48(-86.61,112)
  rect 183x183 smd paste-91 mask+0: 49(0,0)
Top Overlay:
  region: -136,-47.62 -146,-47.62 -146,-62.62 -136,-62.62
  region: 31.12,-136 16.12,-136 16.12,-146 31.12,-146
  region: 136,-0.37 146,-0.37 146,-15.37 136,-15.37
  region: 46.87,136 31.87,136 31.87,146 46.87,146
  lines w6: -123,-103.71 -123,-123 -103.71,-123 ; -123,103.71 -123,123 -103.71,123 ; 103.71,-123 123,-123 123,-103.71 ; 103.71,123 123,123 123,103.71
  text "*" at -163.5,69.49 h50
Top Paste:
  region: -34.44,87.56 -87.56,87.56 -87.56,34.44 -34.44,34.44
  region: -34.44,26.56 -87.56,26.56 -87.56,-26.56 -34.44,-26.56
  region: -34.44,-34.44 -87.56,-34.44 -87.56,-87.56 -34.44,-87.56
  region: 26.56,87.56 -26.56,87.56 -26.56,34.44 26.56,34.44
  region: 26.56,26.56 -26.56,26.56 -26.56,-26.56 26.56,-26.56
  region: 26.56,-34.44 -26.56,-34.44 -26.56,-87.56 26.56,-87.56
  region: 87.56,87.56 34.44,87.56 34.44,34.44 87.56,34.44
  region: 87.56,26.56 34.44,26.56 34.44,-26.56 87.56,-26.56
  region: 87.56,-34.44 34.44,-34.44 34.44,-87.56 87.56,-87.56
Mechanical 5:
  region: 145,-145 -145,-145 -145,145 145,145
Mechanical 13:
  lines w1: -118,68 -68,118 ; -118,-118 118,-118 118,118 -118,118 -118,-118 ; -118,-91.61 -118,-81.61 -118,-91.61 ; -118,-75.87 -118,-65.87 -118,-75.87 ; -118,-60.12 -118,-50.12 -118,-60.12 ; -118,-44.37 -118,-34.37 -118,-44.37 ; -118,-28.62 -118,-18.62 -118,-28.62 ; -118,-12.87 -118,-2.87 -118,-12.87 ; -118,2.87 -118,12.87 -118,2.87 ; -118,18.62 -118,28.62 -118,18.62 ; -118,34.37 -118,44.37 -118,34.37 ; -118,50.12 -118,60.12 -118,50.12 ; -118,65.87 -118,75.87 -118,65.87 ; -118,81.61 -118,91.61 -118,81.61 ; -91.61,-118 -81.61,-118 -91.61,-118 ; -91.61,118 -81.61,118 -91.61,118 ; -75.87,-118 -65.87,-118 -75.87,-118 ; -75.87,118 -65.87,118 -75.87,118 ; -60.12,-118 -50.12,-118 -60.12,-118 ; -60.12,118 -50.12,118 -60.12,118 ; -44.37,-118 -34.37,-118 -44.37,-118 ; -44.37,118 -34.37,118 -44.37,118 ; -28.62,-118 -18.62,-118 -28.62,-118 ; -28.62,118 -18.62,118 -28.62,118 ; -12.87,-118 -2.87,-118 -12.87,-118 ; -12.87,118 -2.87,118 -12.87,118 ; 2.87,-118 12.87,-118 2.87,-118 ; 2.87,118 12.87,118 2.87,118 ; 18.62,-118 28.62,-118 18.62,-118 ; 18.62,118 28.62,118 18.62,118 ; 34.37,-118 44.37,-118 34.37,-118 ; 34.37,118 44.37,118 34.37,118 ; 50.12,-118 60.12,-118 50.12,-118 ; 50.12,118 60.12,118 50.12,118 ; 65.87,-118 75.87,-118 65.87,-118 ; 65.87,118 75.87,118 65.87,118 ; 81.61,-118 91.61,-118 81.61,-118 ; 81.61,118 91.61,118 81.61,118 ; 118,-91.61 118,-81.61 118,-91.61 ; 118,-75.87 118,-65.87 118,-75.87 ; 118,-60.12 118,-50.12 118,-60.12 ; 118,-44.37 118,-34.37 118,-44.37 ; 118,-28.62 118,-18.62 118,-28.62 ; 118,-12.87 118,-2.87 118,-12.87 ; 118,2.87 118,12.87 118,2.87 ; 118,18.62 118,28.62 118,18.62 ; 118,34.37 118,44.37 118,34.37 ; 118,50.12 118,60.12 118,50.12 ; 118,65.87 118,75.87 118,65.87 ; 118,81.61 118,91.61 118,81.61
  text "*" at -110.5,69.49 h50
Mechanical 15:
  region: -94.61,-122 -122,-122 -122,-94.61 -130,-94.61 -130,94.61 -122,94.61 -122,122 -94.61,122 -94.61,130 94.61,130 94.61,122 122,122 122,94.61 130,94.61 130,-94.61 122,-94.61 122,-122 94.61,-122 94.61,-130 -94.61,-130
  lines w6: -130,-94.61 -122,-94.61 -122,-122 -94.61,-122 -94.61,-130 94.61,-130 94.61,-122 122,-122 122,-94.61 130,-94.61 130,94.61 122,94.61 122,122 94.61,122 94.61,130 -94.61,130 -94.61,122 -122,122 -122,94.61 -130,94.61 -130,-94.61
3D body "QFN48_6X6X0P85_RTK.step": height 39.09, standoff 0, extent -117.99,-117.99 117.99,117.99

## QFN48_6X6X0P85_RTK-M [mil]
pads (49):
  rect 36x8 smd paste+0 mask+0: 1(-116,86.61) 2(-116,70.87) 3(-116,55.12) 4(-116,39.37) 5(-116,23.62) 6(-116,7.87) 7(-116,-7.87) 8(-116,-23.62) 9(-116,-39.37) 10(-116,-55.12) 11(-116,-70.87) 12(-116,-86.61) 25(116,-86.61) 26(116,-70.87) 27(116,-55.12) 28(116,-39.37) 29(116,-23.62) 30(116,-7.87) 31(116,7.87) 32(116,23.62) 33(116,39.37) 34(116,55.12) 35(116,70.87) 36(116,86.61)
  rect 8x36 smd paste+0 mask+0: 13(-86.61,-116) 14(-70.87,-116) 15(-55.12,-116) 16(-39.37,-116) 17(-23.62,-116) 18(-7.87,-116) 19(7.87,-116) 20(23.62,-116) 21(39.37,-116) 22(55.12,-116) 23(70.87,-116) 24(86.61,-116) 37(86.61,116) 38(70.87,116) 39(55.12,116) 40(39.37,116) 41(23.62,116) 42(7.87,116) 43(-7.87,116) 44(-23.62,116) 45(-39.37,116) 46(-55.12,116) 47(-70.87,116) 48(-86.61,116)
  rect 183x183 smd paste-91 mask+0: 49(0,0)
Top Overlay:
  region: 46.87,144 31.87,144 31.87,154 46.87,154
  region: 144,-0.37 154,-0.37 154,-15.37 144,-15.37
  region: 31.12,-144 16.12,-144 16.12,-154 31.12,-154
  region: -144,-47.62 -154,-47.62 -154,-62.62 -144,-62.62
  lines w6: -123,-103.71 -123,-123 -103.71,-123 ; -123,103.71 -123,123 -103.71,123 ; 103.71,-123 123,-123 123,-103.71 ; 103.71,123 123,123 123,103.71
  text "*" at -171.5,69.49 h50
Top Paste:
  region: 87.56,-34.44 34.44,-34.44 34.44,-87.56 87.56,-87.56
  region: 87.56,26.56 34.44,26.56 34.44,-26.56 87.56,-26.56
  region: 87.56,87.56 34.44,87.56 34.44,34.44 87.56,34.44
  region: 26.56,-34.44 -26.56,-34.44 -26.56,-87.56 26.56,-87.56
  region: 26.56,26.56 -26.56,26.56 -26.56,-26.56 26.56,-26.56
  region: 26.56,87.56 -26.56,87.56 -26.56,34.44 26.56,34.44
  region: -34.44,-34.44 -87.56,-34.44 -87.56,-87.56 -34.44,-87.56
  region: -34.44,26.56 -87.56,26.56 -87.56,-26.56 -34.44,-26.56
  region: -34.44,87.56 -87.56,87.56 -87.56,34.44 -34.44,34.44
Mechanical 5:
  region: 169,-169 -169,-169 -169,169 169,169
Mechanical 13:
  lines w1: -118,68 -68,118 ; -118,-118 -118,118 118,118 118,-118 -118,-118 ; -118,-91.61 -118,-81.61 -118,-91.61 ; -118,-75.87 -118,-65.87 -118,-75.87 ; -118,-60.12 -118,-50.12 -118,-60.12 ; -118,-44.37 -118,-34.37 -118,-44.37 ; -118,-28.62 -118,-18.62 -118,-28.62 ; -118,-12.87 -118,-2.87 -118,-12.87 ; -118,2.87 -118,12.87 -118,2.87 ; -118,18.62 -118,28.62 -118,18.62 ; -118,34.37 -118,44.37 -118,34.37 ; -118,50.12 -118,60.12 -118,50.12 ; -118,65.87 -118,75.87 -118,65.87 ; -118,81.61 -118,91.61 -118,81.61 ; -91.61,-118 -81.61,-118 -91.61,-118 ; -91.61,118 -81.61,118 -91.61,118 ; -75.87,-118 -65.87,-118 -75.87,-118 ; -75.87,118 -65.87,118 -75.87,118 ; -60.12,-118 -50.12,-118 -60.12,-118 ; -60.12,118 -50.12,118 -60.12,118 ; -44.37,-118 -34.37,-118 -44.37,-118 ; -44.37,118 -34.37,118 -44.37,118 ; -28.62,-118 -18.62,-118 -28.62,-118 ; -28.62,118 -18.62,118 -28.62,118 ; -12.87,-118 -2.87,-118 -12.87,-118 ; -12.87,118 -2.87,118 -12.87,118 ; 2.87,-118 12.87,-118 2.87,-118 ; 2.87,118 12.87,118 2.87,118 ; 18.62,-118 28.62,-118 18.62,-118 ; 18.62,118 28.62,118 18.62,118 ; 34.37,-118 44.37,-118 34.37,-118 ; 34.37,118 44.37,118 34.37,118 ; 50.12,-118 60.12,-118 50.12,-118 ; 50.12,118 60.12,118 50.12,118 ; 65.87,-118 75.87,-118 65.87,-118 ; 65.87,118 75.87,118 65.87,118 ; 81.61,-118 91.61,-118 81.61,-118 ; 81.61,118 91.61,118 81.61,118 ; 118,-91.61 118,-81.61 118,-91.61 ; 118,-75.87 118,-65.87 118,-75.87 ; 118,-60.12 118,-50.12 118,-60.12 ; 118,-44.37 118,-34.37 118,-44.37 ; 118,-28.62 118,-18.62 118,-28.62 ; 118,-12.87 118,-2.87 118,-12.87 ; 118,2.87 118,12.87 118,2.87 ; 118,18.62 118,28.62 118,18.62 ; 118,34.37 118,44.37 118,34.37 ; 118,50.12 118,60.12 118,50.12 ; 118,65.87 118,75.87 118,65.87 ; 118,81.61 118,91.61 118,81.61
  text "*" at -110.5,69.49 h50
Mechanical 15:
  region: -110.61,-138 -138,-138 -138,-110.61 -154,-110.61 -154,110.61 -138,110.61 -138,138 -110.61,138 -110.61,154 110.61,154 110.61,138 138,138 138,110.61 154,110.61 154,-110.61 138,-110.61 138,-138 110.61,-138 110.61,-154 -110.61,-154
  lines w6: -154,-110.61 -154,110.61 -138,110.61 -138,138 -110.61,138 -110.61,154 110.61,154 110.61,138 138,138 138,110.61 154,110.61 154,-110.61 138,-110.61 138,-138 110.61,-138 110.61,-154 -110.61,-154 -110.61,-138 -138,-138 -138,-110.61 -154,-110.61
3D body "QFN48_6X6X0P85_RTK.step": height 39.09, standoff 0, extent -117.99,-117.99 117.99,117.99

## QFN50P400X400X95-24N [mm]
pads (24):
  rect 0.79x0.26 smd: 1(-1.97,1.25) 2(-1.97,0.75) 3(-1.97,0.25) 4(-1.97,-0.25) 5(-1.97,-0.75) 6(-1.97,-1.25) 13(1.97,-1.25) 14(1.97,-0.75) 15(1.97,-0.25) 16(1.97,0.25) 17(1.97,0.75) 18(1.97,1.25)
  rect 0.26x0.79 smd: 7(-1.25,-1.97) 8(-0.75,-1.97) 9(-0.25,-1.97) 10(0.25,-1.97) 11(0.75,-1.97) 12(1.25,-1.97) 19(1.25,1.97) 20(0.75,1.97) 21(0.25,1.97) 22(-0.25,1.97) 23(-0.75,1.97) 24(-1.25,1.97)
Top Overlay:
  circle w0.2: c-3,1.3 r0.1
  lines w0.127: -2.05,-1.56 -2.05,-2.05 -1.56,-2.05 ; -2.05,1.56 -2.05,2.05 -1.56,2.05 ; 1.56,-2.05 2.05,-2.05 2.05,-1.56 ; 1.56,2.05 2.05,2.05 2.05,1.56
Mechanical 13:
  lines w0.127: -2.05,-2.05 -2.05,2.05 2.05,2.05 2.05,-2.05 -2.05,-2.05
Mechanical 15:
  lines w0.05: -2.62,-2.62 -2.62,2.62 2.62,2.62 2.62,-2.62 -2.62,-2.62
3D body "step_temp.STEP": height 0.93, standoff -0.02, extent -2,-2 2,2

## QFN50P400X400X100-25N [mm]
pads (25):
  rrect7% 0.86x0.26 smd: 1(-1.935,1.25) 2(-1.935,0.75) 3(-1.935,0.25) 4(-1.935,-0.25) 5(-1.935,-0.75) 6(-1.935,-1.25) 13(1.935,-1.25) 14(1.935,-0.75) 15(1.935,-0.25) 16(1.935,0.25) 17(1.935,0.75) 18(1.935,1.25)
  rrect7% 0.26x0.86 smd: 7(-1.25,-1.935) 8(-0.75,-1.935) 9(-0.25,-1.935) 10(0.25,-1.935) 11(0.75,-1.935) 12(1.25,-1.935) 19(1.25,1.935) 20(0.75,1.935) 21(0.25,1.935) 22(-0.25,1.935) 23(-0.75,1.935) 24(-1.25,1.935)
  rect 2.5x2.5 smd paste-2: 25(0,0)
Top Overlay:
  circle w0.1: c-2.745,1.26 r0.05
  lines w0.127: -2,-1.65 -2,-2 -1.65,-2 ; -2,1.65 -2,2 -1.65,2 ; 1.65,-2 2,-2 2,-1.65 ; 1.65,2 2,2 2,1.65
Top Paste:
  region: 1.09,0.17 0.17,0.17 0.17,1.09 1.09,1.09
  region: -0.17,0.17 -1.091,0.17 -1.091,1.09 -0.17,1.09
  region: -0.17,-1.092 -1.092,-1.092 -1.092,-0.17 -0.17,-0.17
  region: 1.09,-1.09 0.17,-1.09 0.17,-0.17 1.09,-0.17
Mechanical 13:
  circle w0.1: c-2.195,1.26 r0.05
  lines w0.127: -2,-2 2,-2 2,2 -2,2 -2,-2
Mechanical 15:
  lines w0.05: -2.615,-2.615 2.615,-2.615 2.615,2.615 -2.615,2.615 -2.615,-2.615

## QFN64 [mm]
pads (65):
  rect 7.25x7.25 smd: 0(0,-0.001)
  oval 1.2x0.25 smd: 1(-4.674,3.738) 2(-4.674,3.238) 3(-4.674,2.738) 4(-4.674,2.238) 5(-4.674,1.738) 6(-4.674,1.238) 7(-4.674,0.738) 8(-4.674,0.238) 9(-4.674,-0.262) 10(-4.674,-0.762) 11(-4.674,-1.262) 12(-4.674,-1.762) 13(-4.674,-2.262) 14(-4.674,-2.762) 15(-4.674,-3.262) 16(-4.674,-3.762) 33(4.674,-3.754) 34(4.674,-3.254) 35(4.674,-2.754) 36(4.674,-2.254) 37(4.674,-1.754) 38(4.674,-1.254) 39(4.674,-0.754) 40(4.674,-0.254) 41(4.674,0.246) 42(4.674,0.746) 43(4.674,1.246) 44(4.674,1.746) 45(4.674,2.246) 46(4.674,2.746) 47(4.674,3.246) 48(4.674,3.746)
  oval 0.25x1.2 smd: 17(-3.73,-4.675) 18(-3.23,-4.675) 19(-2.73,-4.675) 20(-2.23,-4.675) 21(-1.73,-4.675) 22(-1.23,-4.675) 23(-0.73,-4.675) 24(-0.23,-4.675) 25(0.27,-4.675) 26(0.77,-4.675) 27(1.27,-4.675) 28(1.77,-4.675) 29(2.27,-4.675) 30(2.77,-4.675) 31(3.27,-4.675) 32(3.77,-4.675) 49(3.767,4.675) 50(3.267,4.675) 51(2.767,4.675) 52(2.267,4.675) 53(1.767,4.675) 54(1.267,4.675) 55(0.767,4.675) 56(0.267,4.675) 57(-0.233,4.675) 58(-0.733,4.675) 59(-1.233,4.675) 60(-1.733,4.675) 61(-2.233,4.675) 62(-2.733,4.675) 63(-3.233,4.675) 64(-3.733,4.675)
Top Overlay:
  lines w0.254: -4.983,-4.116 -4.983,-5.004 -4.089,-5.004 ; -4.983,4.032 -4.983,4.312 -4.31,4.985 -4.064,4.985 ; 4.115,-5.004 5.017,-5.004 5.017,-4.091 ; 4.14,4.995 5.017,4.996 5.017,4.113
3D body "User Library-QFN64-2.step": height 0.9, standoff 0, extent -4.52,-4.521 4.52,4.519

## QFN 40 (6*6*1) [mm] "QFN, 40-Leads, Body 6.1x6.1mm (max), Pitch 0.50mm, IPC Medium Density"
height 1
pads (41):
  oval 0.7x0.25 smd: 1(-3,2.25) 2(-3,1.75) 3(-3,1.25) 4(-3,0.75) 5(-3,0.25) 6(-3,-0.25) 7(-3,-0.75) 8(-3,-1.25) 9(-3,-1.75) 10(-3,-2.25) 21(3,-2.25) 22(3,-1.75) 23(3,-1.25) 24(3,-0.75) 25(3,-0.25) 26(3,0.25) 27(3,0.75) 28(3,1.25) 29(3,1.75) 30(3,2.25)
  oval 0.25x0.7 smd: 11(-2.25,-3) 12(-1.75,-3) 13(-1.25,-3) 14(-0.75,-3) 15(-0.25,-3) 16(0.25,-3) 17(0.75,-3) 18(1.25,-3) 19(1.75,-3) 20(2.25,-3) 31(2.25,3) 32(1.75,3) 33(1.25,3) 34(0.75,3) 35(0.25,3) 36(-0.25,3) 37(-0.75,3) 38(-1.25,3) 39(-1.75,3) 40(-2.25,3)
  rect 3.6x3.6 smd: 41(0,0)
via 1.2,-1.2 diameter 0.66 hole 0.33
via 0,-1.2 diameter 0.66 hole 0.33
via -1.2,-1.2 diameter 0.66 hole 0.33
via 1.2,0 diameter 0.66 hole 0.33
via 0,0 diameter 0.66 hole 0.33
via -1.2,0 diameter 0.66 hole 0.33
via 1.2,1.2 diameter 0.66 hole 0.33
via 0,1.2 diameter 0.66 hole 0.33
via -1.2,1.2 diameter 0.66 hole 0.33
Top Overlay:
  circle w0.25: c-3.9,2.25 r0.125
  lines w0.2: -3.05,-2.525 -3.05,-3.05 -2.525,-3.05 ; -3.05,2.525 -3.05,3.05 -2.525,3.05 ; 2.525,-3.05 3.05,-3.05 3.05,-2.525 ; 2.525,3.05 3.05,3.05 3.05,2.525
Mechanical 13:
  circle w0.1: c-2.1,2.1 r0.5
  lines w0.1: -3.05,-3.05 3.05,-3.05 3.05,3.05 -3.05,3.05 -3.05,-3.05
Mechanical 15:
  lines w0.1: -0.5,0 0.5,0 ; 0,-0.5 0,0.5 ; -3.6,-3.6 3.6,-3.6 3.6,3.6 -3.6,3.6 -3.6,-3.6
3D body "User Library-QFN40 (6x6).step": height 0.9, standoff 0, extent -3,-2.997 3,3.003